# Altium footprint library HeaterController.PcbLib: 7 footprints
Each footprint in its own frame and in the unit in brackets; x right, y up, seen from the top. Pads: shape width x height; smd on the part's side, far side on the other; paste and mask are expansions set on the pad; w line width, h text height; cw(c..) or ccw(c..) is an arc to the next point about the centre after c.
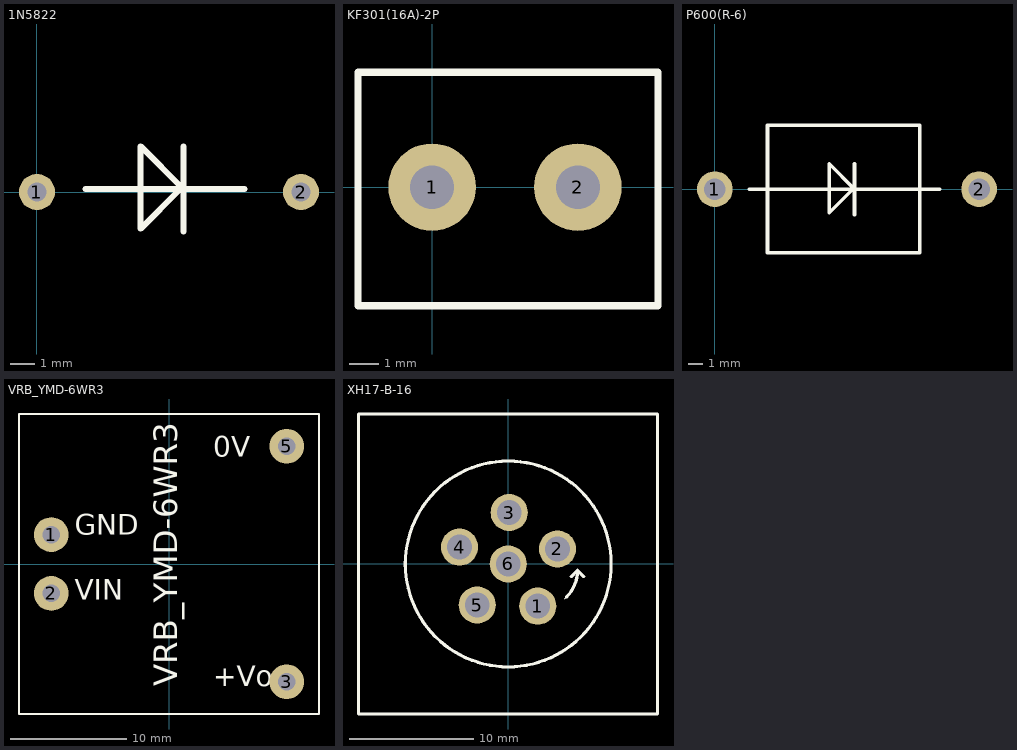
[diagram p0: the footprints below, top view; thin cyan lines are the x and y axes]

## 1N5822 [mm] "Schottky Barrier Plastic Rectifier"
height 10
pads (2):
  round 1.5 hole 0.8: 1(0,0) 2(11,0)
Top Overlay:
  lines w0.254: 2.032,0.127 8.636,0.127 ; 5.969,0.127 4.318,-1.524 4.318,1.905 6.096,0.127 ; 6.096,-1.651 6.096,1.905
3D body "二极管5822.SLDPRT": height 5.55, standoff -3, extent -0.289,-2.554 11.211,2.54

## KF301(16A)-2P [mm]
height 10.08
pads (2):
  round 3 hole 1.5: 1(0,0) 2(5,0)
Top Overlay:
  lines w0.254: -2.54,-4.064 -2.54,3.937 7.747,3.937 7.747,-4.064 -2.54,-4.064
3D body "PCB接线端子-KF301(16A).SLDPRT": height 10.25, standoff -4.35, extent -2.486,-3.937 2.594,3.863
3D body "PCB接线端子-KF301(16A).SLDPRT": height 10.25, standoff -4.35, extent 2.594,-3.937 7.674,3.863

## P600(R-6) [mm]
height 8.8
pads (2):
  round 2.5 hole 1.5: 1(0,0) 2(18.5,0)
Top Overlay:
  lines w0.254: 2.413,0 15.748,0 ; 9.652,0 8.001,-1.651 8.001,1.778 9.779,0 ; 9.779,-1.778 9.779,1.778 ; 3.683,-4.44 3.683,4.471 14.351,4.471 14.351,-4.44 3.683,-4.44
3D body "User Library-P600-2.STEP": height 11.13, standoff -3.11, extent -0.635,-4.55 19.185,4.55

## PCBDEMO [mm]
height 20
3D body "加热控制PCB.SLDPRT": height 0, standoff -1, extent -34.039,-17.127 44.961,16.873

## UK2.5B-02(SCREW) [mm]
height 10.08
3D body "UK2.5B-02螺钉.SLDPRT": height 0, standoff -6, extent -1.75,-1.778 1.75,1.722

## VRB_YMD-6WR3 [mm]
pads (4):
  round 3 hole 1.5: 1(-10.16,2.54) 2(-10.16,-2.54) 3(10.16,-10.16) 5(10.16,10.16)
Top Overlay:
  lines w0.2: -12.95,-12.95 12.95,-12.95 12.95,12.95 -12.95,12.95 -12.95,-12.95
  text "VRB_YMD-6WR3" at 1.397,-10.541 h3.5
  text "0V" at 3.81,8.636 h3
  text "+Vo" at 3.81,-11.176 h3
  text "VIN" at -8.128,-3.683 h3
  text "GND" at -8.125,1.905 h3
3D body "VRB4812YMD-6WR3.SLDPRT": height 11.7, standoff -4.1, extent -12.7,-12.7 12.7,12.7

## XH17-B-16 [mm]
pads (6):
  round 3 hole 2: 1(2.38,-3.4) 2(3.97,1.21) 3(0.08,4.15) 4(-3.93,1.36) 5(-2.5,-3.31) 6(0,0)
Top Overlay:
  circle w0.254: c0,0 r8.3
  lines w0.013: 4.572,-2.794 4.69,-2.676
  lines w0.254: 4.69,-2.676 ccw(c2.522,-0.508) 5.588,-0.508 ; 5.08,-1.016 5.588,-0.508 ; 6.096,-1.016 5.588,-0.508 ; -12.085,-12.1 12.048,-12.1 12.048,12.097 -12.085,12.097 -12.085,-12.1
  text "." at 4.318,-3.429 h1.52
Bottom Overlay:
  circle w0.254: c0,0 r8.3
  lines w0.013: 4.572,-2.794 4.69,-2.676
  lines w0.254: 4.69,-2.676 ccw(c2.522,-0.508) 5.588,-0.508 ; 5.08,-1.016 5.588,-0.508 ; 6.096,-1.016 5.588,-0.508
  text "." at 4.318,-3.429 h1.52
3D body "XH17-B-16.SLDPRT": height 18.3, standoff -3.8, extent -12.208,-12.2 12.192,12.2